# Altium integrated library Samtec_2_mm_Pitch_Socket_Strips.IntLib: 251 symbols (part 2 of 3)
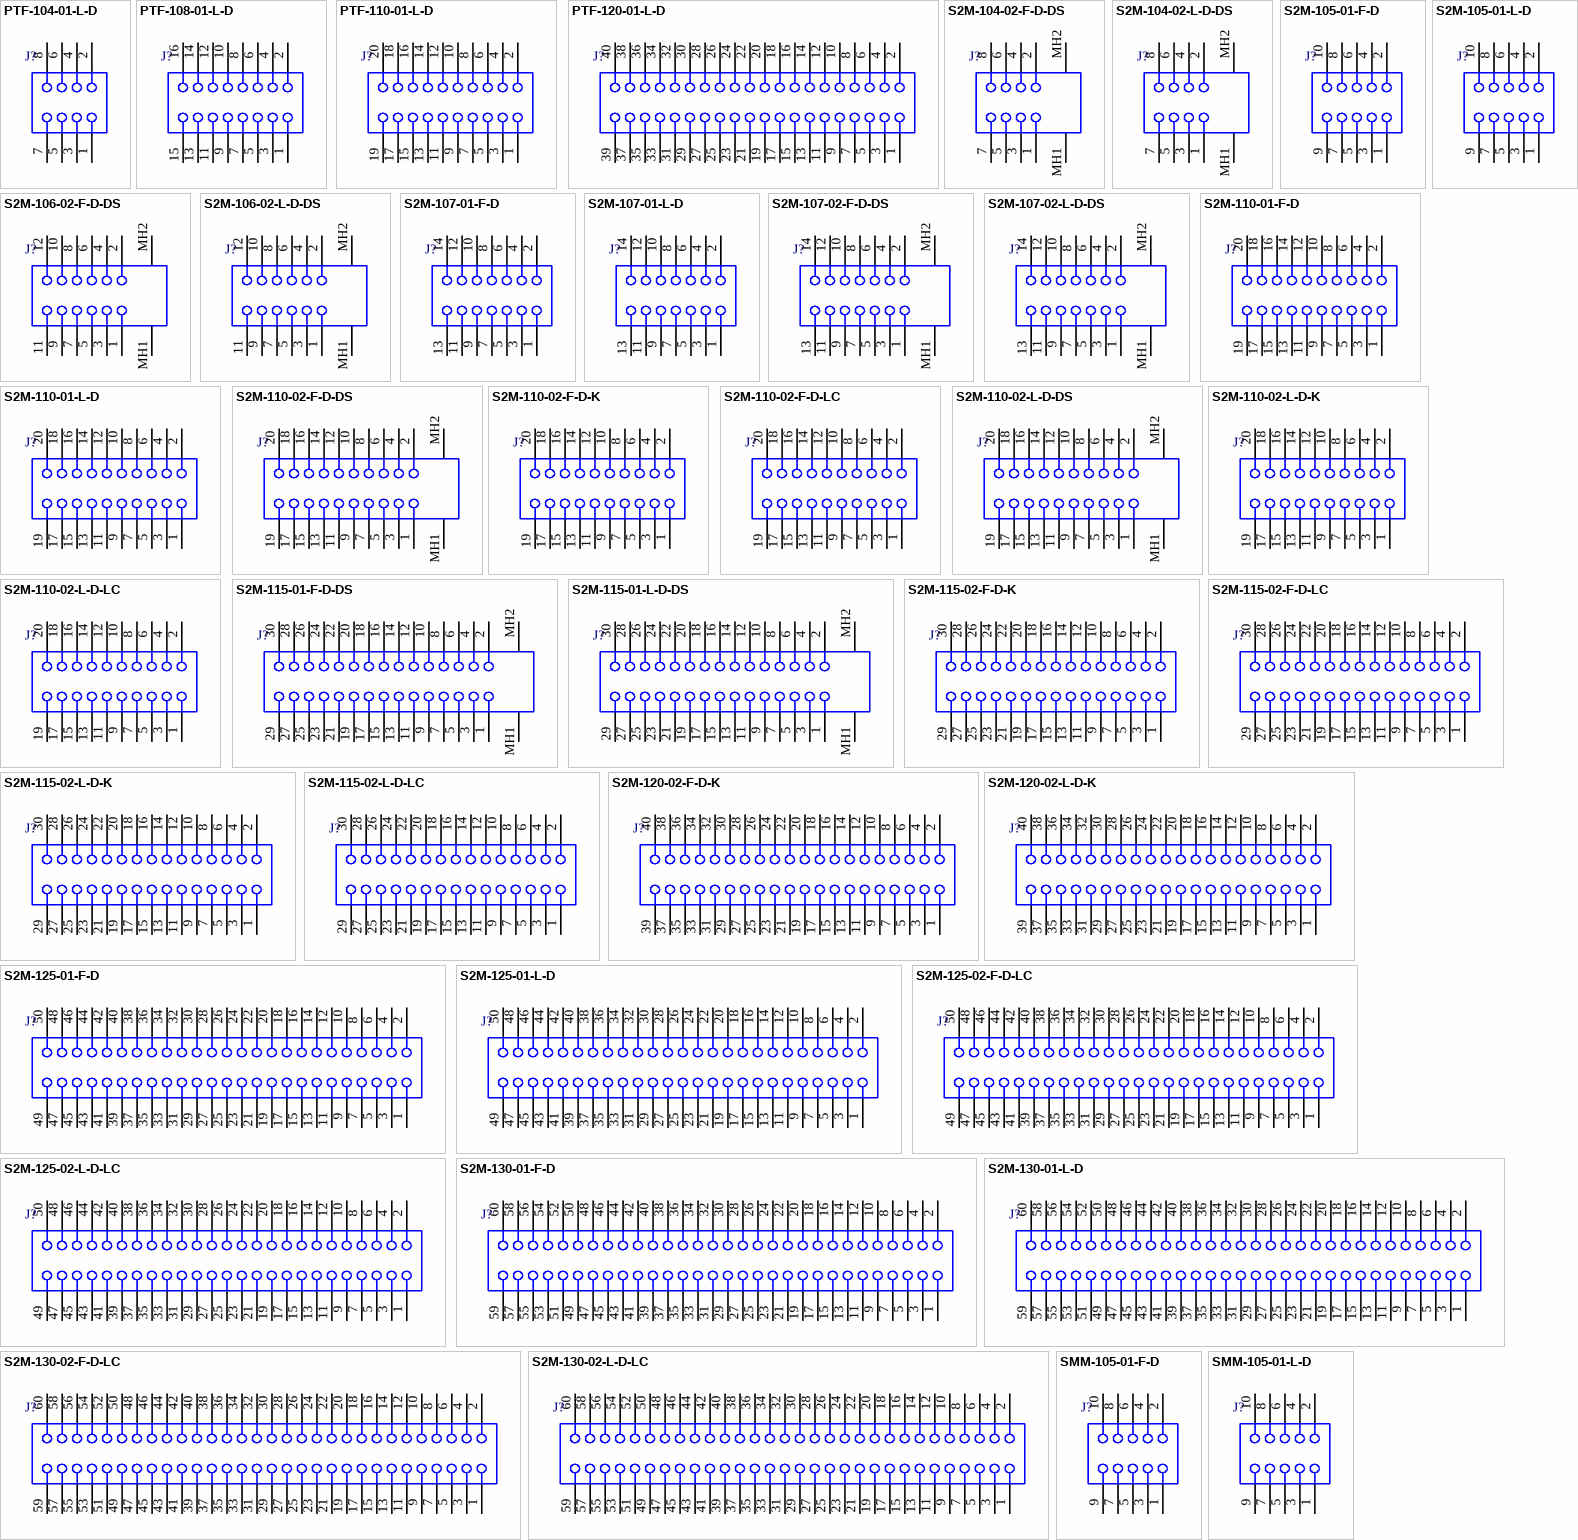
[diagram p7: symbols PTF-104-01-L-D to SMM-105-01-L-D]

## S2M-106-02-L-D-DS
designator J?
High Reliability Cable Socket, Surface Mount, Vertical, -55 to 125 degC, 2 mm Pitch, 12-Pin, Female, RoHS; Manufacturer: Samtec; PartNumber: S2M-106-02-L-D-DS; Pitch: 2 mm; DatasheetVersion: F-214; PackageVersion: M, 9/2010; PackageReference: S2M-106-02-X-D-DS; PackageDescription: 2 mm Double Row Socket Strip; Orientation: Vertical; RoHS: True; Temperature Range: -55 to 125 degC; Mounting Technology: Surface Mount; ComponentLink1Description: Manufacturer URL; ComponentLink1URL: http://www.samtec.com; ComponentLink2Description: Datasheet; ComponentLink2URL: http://www.samtec.com/documents/webfiles/pdf/s2m.pdf; ComponentLink3Description: Package Specification; ComponentLink3URL: http://www.samtec.com/documents/webfiles/cpdf/S2M-1XX-XX-X-D-XX-XX-MKT.pdf
footprint SMTC-S2M-106-02-X-D-DS (Socket Strip, 2x6 Pins, Vertical, 2mm Pitch, Female)
pins: 1, 2, 3, 4, 5, 6, 7, 8, 9, 10, 11, 12, MH1, MH2

## S2M-107-01-F-D
designator J?
High Reliability Cable Socket, Through-hole, Vertical, -55 to 125 degC, 2 mm Pitch, 14-Pin, Female, RoHS; Manufacturer: Samtec; PartNumber: S2M-107-01-F-D; Pitch: 2 mm; DatasheetVersion: F-214; PackageVersion: M, 9/2010; PackageReference: S2M-107-01-X-D; PackageDescription: 2 mm Double Row Socket Strip; Orientation: Vertical; RoHS: True; Temperature Range: -55 to 125 degC; Mounting Technology: Through-hole; ComponentLink1Description: Manufacturer URL; ComponentLink1URL: http://www.samtec.com; ComponentLink2Description: Datasheet; ComponentLink2URL: http://www.samtec.com/documents/webfiles/pdf/s2m.pdf; ComponentLink3Description: Package Specification; ComponentLink3URL: http://www.samtec.com/documents/webfiles/cpdf/S2M-1XX-XX-X-D-XX-XX-MKT.pdf
footprint SMTC-S2M-107-01-X-D (Socket Strip, 2x7 Pins, Vertical, 2mm Pitch, Female)
pins: 1, 2, 3, 4, 5, 6, 7, 8, 9, 10, 11, 12, 13, 14

## S2M-107-01-L-D
designator J?
High Reliability Cable Socket, Through-hole, Vertical, -55 to 125 degC, 2 mm Pitch, 14-Pin, Female, RoHS; Manufacturer: Samtec; PartNumber: S2M-107-01-L-D; Pitch: 2 mm; DatasheetVersion: F-214; PackageVersion: M, 9/2010; PackageReference: S2M-107-01-X-D; PackageDescription: 2 mm Double Row Socket Strip; Supplier 1: Farnell; Supplier Part Number 1: 2085241; Orientation: Vertical; RoHS: True; Temperature Range: -55 to 125 degC; Mounting Technology: Through-hole; ComponentLink1Description: Manufacturer URL; ComponentLink1URL: http://www.samtec.com; ComponentLink2Description: Datasheet; ComponentLink2URL: http://www.samtec.com/documents/webfiles/pdf/s2m.pdf; ComponentLink3Description: Package Specification; ComponentLink3URL: http://www.samtec.com/documents/webfiles/cpdf/S2M-1XX-XX-X-D-XX-XX-MKT.pdf
footprint SMTC-S2M-107-01-X-D (Socket Strip, 2x7 Pins, Vertical, 2mm Pitch, Female)
pins: 1, 2, 3, 4, 5, 6, 7, 8, 9, 10, 11, 12, 13, 14

## S2M-107-02-F-D-DS
designator J?
High Reliability Cable Socket, Surface Mount, Vertical, -55 to 125 degC, 2 mm Pitch, 14-Pin, Female, RoHS; Manufacturer: Samtec; PartNumber: S2M-107-02-F-D-DS; Pitch: 2 mm; DatasheetVersion: F-214; PackageVersion: M, 9/2010; PackageReference: S2M-107-02-X-D-DS; PackageDescription: 2 mm Double Row Socket Strip; Orientation: Vertical; RoHS: True; Temperature Range: -55 to 125 degC; Mounting Technology: Surface Mount; ComponentLink1Description: Manufacturer URL; ComponentLink1URL: http://www.samtec.com; ComponentLink2Description: Datasheet; ComponentLink2URL: http://www.samtec.com/documents/webfiles/pdf/s2m.pdf; ComponentLink3Description: Package Specification; ComponentLink3URL: http://www.samtec.com/documents/webfiles/cpdf/S2M-1XX-XX-X-D-XX-XX-MKT.pdf
footprint SMTC-S2M-107-02-X-D-DS (Socket Strip, 2x7 Pins, Vertical, 2mm Pitch, Female)
pins: 1, 2, 3, 4, 5, 6, 7, 8, 9, 10, 11, 12, 13, 14, MH1, MH2

## S2M-107-02-L-D-DS
designator J?
High Reliability Cable Socket, Surface Mount, Vertical, -55 to 125 degC, 2 mm Pitch, 14-Pin, Female, RoHS; Manufacturer: Samtec; PartNumber: S2M-107-02-L-D-DS; Pitch: 2 mm; DatasheetVersion: F-214; PackageVersion: M, 9/2010; PackageReference: S2M-107-02-X-D-DS; PackageDescription: 2 mm Double Row Socket Strip; Orientation: Vertical; RoHS: True; Temperature Range: -55 to 125 degC; Mounting Technology: Surface Mount; ComponentLink1Description: Manufacturer URL; ComponentLink1URL: http://www.samtec.com; ComponentLink2Description: Datasheet; ComponentLink2URL: http://www.samtec.com/documents/webfiles/pdf/s2m.pdf; ComponentLink3Description: Package Specification; ComponentLink3URL: http://www.samtec.com/documents/webfiles/cpdf/S2M-1XX-XX-X-D-XX-XX-MKT.pdf
footprint SMTC-S2M-107-02-X-D-DS (Socket Strip, 2x7 Pins, Vertical, 2mm Pitch, Female)
pins: 1, 2, 3, 4, 5, 6, 7, 8, 9, 10, 11, 12, 13, 14, MH1, MH2

## S2M-110-01-F-D
designator J?
High Reliability Cable Socket, Through-hole, Vertical, -55 to 125 degC, 2 mm Pitch, 20-Pin, Female, RoHS; Manufacturer: Samtec; PartNumber: S2M-110-01-F-D; Pitch: 2 mm; DatasheetVersion: F-214; PackageVersion: M, 9/2010; PackageReference: S2M-110-01-X-D; PackageDescription: 2 mm Double Row Socket Strip; Orientation: Vertical; RoHS: True; Temperature Range: -55 to 125 degC; Mounting Technology: Through-hole; ComponentLink1Description: Manufacturer URL; ComponentLink1URL: http://www.samtec.com; ComponentLink2Description: Datasheet; ComponentLink2URL: http://www.samtec.com/documents/webfiles/pdf/s2m.pdf; ComponentLink3Description: Package Specification; ComponentLink3URL: http://www.samtec.com/documents/webfiles/cpdf/S2M-1XX-XX-X-D-XX-XX-MKT.pdf
footprint SMTC-S2M-110-01-X-D (Socket Strip, 2x10 Pins, Vertical, 2mm Pitch, Female)
pins: 1, 2, 3, 4, 5, 6, 7, 8, 9, 10, 11, 12, 13, 14, 15, 16, 17, 18, 19, 20

## S2M-110-01-L-D
designator J?
High Reliability Cable Socket, Through-hole, Vertical, -55 to 125 degC, 2 mm Pitch, 20-Pin, Female, RoHS; Manufacturer: Samtec; PartNumber: S2M-110-01-L-D; Pitch: 2 mm; DatasheetVersion: F-214; PackageVersion: M, 9/2010; PackageReference: S2M-110-01-X-D; PackageDescription: 2 mm Double Row Socket Strip; Supplier 1: Farnell; Supplier Part Number 1: 2085242; Orientation: Vertical; RoHS: True; Temperature Range: -55 to 125 degC; Mounting Technology: Through-hole; ComponentLink1Description: Manufacturer URL; ComponentLink1URL: http://www.samtec.com; ComponentLink2Description: Datasheet; ComponentLink2URL: http://www.samtec.com/documents/webfiles/pdf/s2m.pdf; ComponentLink3Description: Package Specification; ComponentLink3URL: http://www.samtec.com/documents/webfiles/cpdf/S2M-1XX-XX-X-D-XX-XX-MKT.pdf
footprint SMTC-S2M-110-01-X-D (Socket Strip, 2x10 Pins, Vertical, 2mm Pitch, Female)
pins: 1, 2, 3, 4, 5, 6, 7, 8, 9, 10, 11, 12, 13, 14, 15, 16, 17, 18, 19, 20

## S2M-110-02-F-D-DS
designator J?
High Reliability Cable Socket, Surface Mount, Vertical, -55 to 125 degC, 2 mm Pitch, 20-Pin, Female, RoHS; Manufacturer: Samtec; PartNumber: S2M-110-02-F-D-DS; Pitch: 2 mm; DatasheetVersion: F-214; PackageVersion: M, 9/2010; PackageReference: S2M-110-02-X-D-DS; PackageDescription: 2 mm Double Row Socket Strip; Orientation: Vertical; RoHS: True; Temperature Range: -55 to 125 degC; Mounting Technology: Surface Mount; ComponentLink1Description: Manufacturer URL; ComponentLink1URL: http://www.samtec.com; ComponentLink2Description: Datasheet; ComponentLink2URL: http://www.samtec.com/documents/webfiles/pdf/s2m.pdf; ComponentLink3Description: Package Specification; ComponentLink3URL: http://www.samtec.com/documents/webfiles/cpdf/S2M-1XX-XX-X-D-XX-XX-MKT.pdf
footprint SMTC-S2M-110-02-X-D-DS (Socket Strip, 2x10 Pins, Vertical, 2mm Pitch, Female)
pins: 1, 2, 3, 4, 5, 6, 7, 8, 9, 10, 11, 12, 13, 14, 15, 16, 17, 18, 19, 20, MH1, MH2

## S2M-110-02-F-D-K
designator J?
High Reliability Cable Socket, Surface Mount, Vertical, -55 to 125 degC, 2 mm Pitch, 20-Pin, Female, RoHS; Manufacturer: Samtec; PartNumber: S2M-110-02-F-D-K; Pitch: 2 mm; DatasheetVersion: F-214; PackageVersion: M, 9/2010; PackageReference: S2M-110-02-X-D-K; PackageDescription: 2 mm Double Row Socket Strip; Orientation: Vertical; RoHS: True; Temperature Range: -55 to 125 degC; Mounting Technology: Surface Mount; ComponentLink1Description: Manufacturer URL; ComponentLink1URL: http://www.samtec.com; ComponentLink2Description: Datasheet; ComponentLink2URL: http://www.samtec.com/documents/webfiles/pdf/s2m.pdf; ComponentLink3Description: Package Specification; ComponentLink3URL: http://www.samtec.com/documents/webfiles/cpdf/S2M-1XX-XX-X-D-XX-XX-MKT.pdf
footprint SMTC-S2M-110-02-X-D-K (Socket Strip, 2x10 Pins, Vertical, 2mm Pitch, Female)
pins: 1, 2, 3, 4, 5, 6, 7, 8, 9, 10, 11, 12, 13, 14, 15, 16, 17, 18, 19, 20

## S2M-110-02-F-D-LC
designator J?
High Reliability Cable Socket, Surface Mount, Vertical, -55 to 125 degC, 2 mm Pitch, 20-Pin, Female, RoHS; Manufacturer: Samtec; PartNumber: S2M-110-02-F-D-LC; Pitch: 2 mm; DatasheetVersion: F-214; PackageVersion: M, 9/2010; PackageReference: S2M-110-02-X-D-LC; PackageDescription: 2 mm Double Row Socket Strip; Orientation: Vertical; RoHS: True; Temperature Range: -55 to 125 degC; Mounting Technology: Surface Mount; ComponentLink1Description: Manufacturer URL; ComponentLink1URL: http://www.samtec.com; ComponentLink2Description: Datasheet; ComponentLink2URL: http://www.samtec.com/documents/webfiles/pdf/s2m.pdf; ComponentLink3Description: Package Specification; ComponentLink3URL: http://www.samtec.com/documents/webfiles/cpdf/S2M-1XX-XX-X-D-XX-XX-MKT.pdf
footprint SMTC-S2M-110-02-X-D-LC (Socket Strip, 2x10 Pins, Vertical, 2mm Pitch, Female)
pins: 1, 2, 3, 4, 5, 6, 7, 8, 9, 10, 11, 12, 13, 14, 15, 16, 17, 18, 19, 20

## S2M-110-02-L-D-DS
designator J?
High Reliability Cable Socket, Surface Mount, Vertical, -55 to 125 degC, 2 mm Pitch, 20-Pin, Female, RoHS; Manufacturer: Samtec; PartNumber: S2M-110-02-L-D-DS; Pitch: 2 mm; DatasheetVersion: F-214; PackageVersion: M, 9/2010; PackageReference: S2M-110-02-X-D-DS; PackageDescription: 2 mm Double Row Socket Strip; Orientation: Vertical; RoHS: True; Temperature Range: -55 to 125 degC; Mounting Technology: Surface Mount; ComponentLink1Description: Manufacturer URL; ComponentLink1URL: http://www.samtec.com; ComponentLink2Description: Datasheet; ComponentLink2URL: http://www.samtec.com/documents/webfiles/pdf/s2m.pdf; ComponentLink3Description: Package Specification; ComponentLink3URL: http://www.samtec.com/documents/webfiles/cpdf/S2M-1XX-XX-X-D-XX-XX-MKT.pdf
footprint SMTC-S2M-110-02-X-D-DS (Socket Strip, 2x10 Pins, Vertical, 2mm Pitch, Female)
pins: 1, 2, 3, 4, 5, 6, 7, 8, 9, 10, 11, 12, 13, 14, 15, 16, 17, 18, 19, 20, MH1, MH2

## S2M-110-02-L-D-K
designator J?
High Reliability Cable Socket, Surface Mount, Vertical, -55 to 125 degC, 2 mm Pitch, 20-Pin, Female, RoHS; Manufacturer: Samtec; PartNumber: S2M-110-02-L-D-K; Pitch: 2 mm; DatasheetVersion: F-214; PackageVersion: M, 9/2010; PackageReference: S2M-110-02-X-D-K; PackageDescription: 2 mm Double Row Socket Strip; Orientation: Vertical; RoHS: True; Temperature Range: -55 to 125 degC; Mounting Technology: Surface Mount; ComponentLink1Description: Manufacturer URL; ComponentLink1URL: http://www.samtec.com; ComponentLink2Description: Datasheet; ComponentLink2URL: http://www.samtec.com/documents/webfiles/pdf/s2m.pdf; ComponentLink3Description: Package Specification; ComponentLink3URL: http://www.samtec.com/documents/webfiles/cpdf/S2M-1XX-XX-X-D-XX-XX-MKT.pdf
footprint SMTC-S2M-110-02-X-D-K (Socket Strip, 2x10 Pins, Vertical, 2mm Pitch, Female)
pins: 1, 2, 3, 4, 5, 6, 7, 8, 9, 10, 11, 12, 13, 14, 15, 16, 17, 18, 19, 20

## S2M-110-02-L-D-LC
designator J?
High Reliability Cable Socket, Surface Mount, Vertical, -55 to 125 degC, 2 mm Pitch, 20-Pin, Female, RoHS; Manufacturer: Samtec; PartNumber: S2M-110-02-L-D-LC; Pitch: 2 mm; DatasheetVersion: F-214; PackageVersion: M, 9/2010; PackageReference: S2M-110-02-X-D-LC; PackageDescription: 2 mm Double Row Socket Strip; Orientation: Vertical; RoHS: True; Temperature Range: -55 to 125 degC; Mounting Technology: Surface Mount; ComponentLink1Description: Manufacturer URL; ComponentLink1URL: http://www.samtec.com; ComponentLink2Description: Datasheet; ComponentLink2URL: http://www.samtec.com/documents/webfiles/pdf/s2m.pdf; ComponentLink3Description: Package Specification; ComponentLink3URL: http://www.samtec.com/documents/webfiles/cpdf/S2M-1XX-XX-X-D-XX-XX-MKT.pdf
footprint SMTC-S2M-110-02-X-D-LC (Socket Strip, 2x10 Pins, Vertical, 2mm Pitch, Female)
pins: 1, 2, 3, 4, 5, 6, 7, 8, 9, 10, 11, 12, 13, 14, 15, 16, 17, 18, 19, 20

## S2M-115-01-F-D-DS
designator J?
High Reliability Cable Socket, Through-hole, Vertical, -55 to 125 degC, 2 mm Pitch, 30-Pin, Female, RoHS; Manufacturer: Samtec; PartNumber: S2M-115-01-F-D-DS; Pitch: 2 mm; DatasheetVersion: F-214; PackageVersion: M, 9/2010; PackageReference: S2M-115-01-X-D-DS; PackageDescription: 2 mm Double Row Socket Strip; Orientation: Vertical; RoHS: True; Temperature Range: -55 to 125 degC; Mounting Technology: Through-hole; ComponentLink1Description: Manufacturer URL; ComponentLink1URL: http://www.samtec.com; ComponentLink2Description: Datasheet; ComponentLink2URL: http://www.samtec.com/documents/webfiles/pdf/s2m.pdf; ComponentLink3Description: Package Specification; ComponentLink3URL: http://www.samtec.com/documents/webfiles/cpdf/S2M-1XX-XX-X-D-XX-XX-MKT.pdf
footprint SMTC-S2M-115-01-X-D-DS (Socket Strip, 2x15 Pins, Vertical, 2mm Pitch, Female)
pins: 1, 2, 3, 4, 5, 6, 7, 8, 9, 10, 11, 12, 13, 14, 15, 16, 17, 18, 19, 20, 21, 22, 23, 24, 25, 26, 27, 28, 29, 30, MH1, MH2

## S2M-115-01-L-D-DS
designator J?
High Reliability Cable Socket, Through-hole, Vertical, -55 to 125 degC, 2 mm Pitch, 30-Pin, Female, RoHS; Manufacturer: Samtec; PartNumber: S2M-115-01-L-D-DS; Pitch: 2 mm; DatasheetVersion: F-214; PackageVersion: M, 9/2010; PackageReference: S2M-115-01-X-D-DS; PackageDescription: 2 mm Double Row Socket Strip; Orientation: Vertical; RoHS: True; Temperature Range: -55 to 125 degC; Mounting Technology: Through-hole; ComponentLink1Description: Manufacturer URL; ComponentLink1URL: http://www.samtec.com; ComponentLink2Description: Datasheet; ComponentLink2URL: http://www.samtec.com/documents/webfiles/pdf/s2m.pdf; ComponentLink3Description: Package Specification; ComponentLink3URL: http://www.samtec.com/documents/webfiles/cpdf/S2M-1XX-XX-X-D-XX-XX-MKT.pdf
footprint SMTC-S2M-115-01-X-D-DS (Socket Strip, 2x15 Pins, Vertical, 2mm Pitch, Female)
pins: 1, 2, 3, 4, 5, 6, 7, 8, 9, 10, 11, 12, 13, 14, 15, 16, 17, 18, 19, 20, 21, 22, 23, 24, 25, 26, 27, 28, 29, 30, MH1, MH2

## S2M-115-02-F-D-K
designator J?
High Reliability Cable Socket, Surface Mount, Vertical, -55 to 125 degC, 2 mm Pitch, 30-Pin, Female, RoHS; Manufacturer: Samtec; PartNumber: S2M-115-02-F-D-K; Pitch: 2 mm; DatasheetVersion: F-214; PackageVersion: M, 9/2010; PackageReference: S2M-115-02-X-D-K; PackageDescription: 2 mm Double Row Socket Strip; Orientation: Vertical; RoHS: True; Temperature Range: -55 to 125 degC; Mounting Technology: Surface Mount; ComponentLink1Description: Manufacturer URL; ComponentLink1URL: http://www.samtec.com; ComponentLink2Description: Datasheet; ComponentLink2URL: http://www.samtec.com/documents/webfiles/pdf/s2m.pdf; ComponentLink3Description: Package Specification; ComponentLink3URL: http://www.samtec.com/documents/webfiles/cpdf/S2M-1XX-XX-X-D-XX-XX-MKT.pdf
footprint SMTC-S2M-115-02-X-D-K (Socket Strip, 2x15 Pins, Vertical, 2mm Pitch, Female)
pins: 1, 2, 3, 4, 5, 6, 7, 8, 9, 10, 11, 12, 13, 14, 15, 16, 17, 18, 19, 20, 21, 22, 23, 24, 25, 26, 27, 28, 29, 30

## S2M-115-02-F-D-LC
designator J?
High Reliability Cable Socket, Surface Mount, Vertical, -55 to 125 degC, 2 mm Pitch, 30-Pin, Female, RoHS; Manufacturer: Samtec; PartNumber: S2M-115-02-F-D-LC; Pitch: 2 mm; DatasheetVersion: F-214; PackageVersion: M, 9/2010; PackageReference: S2M-115-02-X-D-LC; PackageDescription: 2 mm Double Row Socket Strip; Orientation: Vertical; RoHS: True; Temperature Range: -55 to 125 degC; Mounting Technology: Surface Mount; ComponentLink1Description: Manufacturer URL; ComponentLink1URL: http://www.samtec.com; ComponentLink2Description: Datasheet; ComponentLink2URL: http://www.samtec.com/documents/webfiles/pdf/s2m.pdf; ComponentLink3Description: Package Specification; ComponentLink3URL: http://www.samtec.com/documents/webfiles/cpdf/S2M-1XX-XX-X-D-XX-XX-MKT.pdf
footprint SMTC-S2M-115-02-X-D-LC (Socket Strip, 2x15 Pins, Vertical, 2mm Pitch, Female)
pins: 1, 2, 3, 4, 5, 6, 7, 8, 9, 10, 11, 12, 13, 14, 15, 16, 17, 18, 19, 20, 21, 22, 23, 24, 25, 26, 27, 28, 29, 30

## S2M-115-02-L-D-K
designator J?
High Reliability Cable Socket, Surface Mount, Vertical, -55 to 125 degC, 2 mm Pitch, 30-Pin, Female, RoHS; Manufacturer: Samtec; PartNumber: S2M-115-02-L-D-K; Pitch: 2 mm; DatasheetVersion: F-214; PackageVersion: M, 9/2010; PackageReference: S2M-115-02-X-D-K; PackageDescription: 2 mm Double Row Socket Strip; Orientation: Vertical; RoHS: True; Temperature Range: -55 to 125 degC; Mounting Technology: Surface Mount; ComponentLink1Description: Manufacturer URL; ComponentLink1URL: http://www.samtec.com; ComponentLink2Description: Datasheet; ComponentLink2URL: http://www.samtec.com/documents/webfiles/pdf/s2m.pdf; ComponentLink3Description: Package Specification; ComponentLink3URL: http://www.samtec.com/documents/webfiles/cpdf/S2M-1XX-XX-X-D-XX-XX-MKT.pdf
footprint SMTC-S2M-115-02-X-D-K (Socket Strip, 2x15 Pins, Vertical, 2mm Pitch, Female)
pins: 1, 2, 3, 4, 5, 6, 7, 8, 9, 10, 11, 12, 13, 14, 15, 16, 17, 18, 19, 20, 21, 22, 23, 24, 25, 26, 27, 28, 29, 30

## S2M-115-02-L-D-LC
designator J?
High Reliability Cable Socket, Surface Mount, Vertical, -55 to 125 degC, 2 mm Pitch, 30-Pin, Female, RoHS; Manufacturer: Samtec; PartNumber: S2M-115-02-L-D-LC; Pitch: 2 mm; DatasheetVersion: F-214; PackageVersion: M, 9/2010; PackageReference: S2M-115-02-X-D-LC; PackageDescription: 2 mm Double Row Socket Strip; Orientation: Vertical; RoHS: True; Temperature Range: -55 to 125 degC; Mounting Technology: Surface Mount; ComponentLink1Description: Manufacturer URL; ComponentLink1URL: http://www.samtec.com; ComponentLink2Description: Datasheet; ComponentLink2URL: http://www.samtec.com/documents/webfiles/pdf/s2m.pdf; ComponentLink3Description: Package Specification; ComponentLink3URL: http://www.samtec.com/documents/webfiles/cpdf/S2M-1XX-XX-X-D-XX-XX-MKT.pdf
footprint SMTC-S2M-115-02-X-D-LC (Socket Strip, 2x15 Pins, Vertical, 2mm Pitch, Female)
pins: 1, 2, 3, 4, 5, 6, 7, 8, 9, 10, 11, 12, 13, 14, 15, 16, 17, 18, 19, 20, 21, 22, 23, 24, 25, 26, 27, 28, 29, 30

## S2M-120-02-F-D-K
designator J?
High Reliability Cable Socket, Surface Mount, Vertical, -55 to 125 degC, 2 mm Pitch, 40-Pin, Female, RoHS; Manufacturer: Samtec; PartNumber: S2M-120-02-F-D-K; Pitch: 2 mm; DatasheetVersion: F-214; PackageVersion: M, 9/2010; PackageReference: S2M-120-02-X-D-K; PackageDescription: 2 mm Double Row Socket Strip; Orientation: Vertical; RoHS: True; Temperature Range: -55 to 125 degC; Mounting Technology: Surface Mount; ComponentLink1Description: Manufacturer URL; ComponentLink1URL: http://www.samtec.com; ComponentLink2Description: Datasheet; ComponentLink2URL: http://www.samtec.com/documents/webfiles/pdf/s2m.pdf; ComponentLink3Description: Package Specification; ComponentLink3URL: http://www.samtec.com/documents/webfiles/cpdf/S2M-1XX-XX-X-D-XX-XX-MKT.pdf
footprint SMTC-S2M-120-02-X-D-K (Socket Strip, 2x20 Pins, Vertical, 2mm Pitch, Female)
pins: 1, 2, 3, 4, 5, 6, 7, 8, 9, 10, 11, 12, 13, 14, 15, 16, 17, 18, 19, 20, 21, 22, 23, 24, 25, 26, 27, 28, 29, 30, 31, 32, 33, 34, 35, 36, 37, 38, 39, 40

## S2M-120-02-L-D-K
designator J?
High Reliability Cable Socket, Surface Mount, Vertical, -55 to 125 degC, 2 mm Pitch, 40-Pin, Female, RoHS; Manufacturer: Samtec; PartNumber: S2M-120-02-L-D-K; Pitch: 2 mm; DatasheetVersion: F-214; PackageVersion: M, 9/2010; PackageReference: S2M-120-02-X-D-K; PackageDescription: 2 mm Double Row Socket Strip; Orientation: Vertical; RoHS: True; Temperature Range: -55 to 125 degC; Mounting Technology: Surface Mount; ComponentLink1Description: Manufacturer URL; ComponentLink1URL: http://www.samtec.com; ComponentLink2Description: Datasheet; ComponentLink2URL: http://www.samtec.com/documents/webfiles/pdf/s2m.pdf; ComponentLink3Description: Package Specification; ComponentLink3URL: http://www.samtec.com/documents/webfiles/cpdf/S2M-1XX-XX-X-D-XX-XX-MKT.pdf
footprint SMTC-S2M-120-02-X-D-K (Socket Strip, 2x20 Pins, Vertical, 2mm Pitch, Female)
pins: 1, 2, 3, 4, 5, 6, 7, 8, 9, 10, 11, 12, 13, 14, 15, 16, 17, 18, 19, 20, 21, 22, 23, 24, 25, 26, 27, 28, 29, 30, 31, 32, 33, 34, 35, 36, 37, 38, 39, 40

## S2M-125-01-F-D
designator J?
High Reliability Cable Socket, Through-hole, Vertical, -55 to 125 degC, 2 mm Pitch, 50-Pin, Female, RoHS; Manufacturer: Samtec; PartNumber: S2M-125-01-F-D; Pitch: 2 mm; DatasheetVersion: F-214; PackageVersion: M, 9/2010; PackageReference: S2M-125-01-X-D; PackageDescription: 2 mm Double Row Socket Strip; Orientation: Vertical; RoHS: True; Temperature Range: -55 to 125 degC; Mounting Technology: Through-hole; ComponentLink1Description: Manufacturer URL; ComponentLink1URL: http://www.samtec.com; ComponentLink2Description: Datasheet; ComponentLink2URL: http://www.samtec.com/documents/webfiles/pdf/s2m.pdf; ComponentLink3Description: Package Specification; ComponentLink3URL: http://www.samtec.com/documents/webfiles/cpdf/S2M-1XX-XX-X-D-XX-XX-MKT.pdf
footprint SMTC-S2M-125-01-X-D (Socket Strip, 2x25 Pins, Vertical, 2mm Pitch, Female)
pins: 1, 2, 3, 4, 5, 6, 7, 8, 9, 10, 11, 12, 13, 14, 15, 16, 17, 18, 19, 20, 21, 22, 23, 24, 25, 26, 27, 28, 29, 30, 31, 32, 33, 34, 35, 36, 37, 38, 39, 40, 41, 42, 43, 44, 45, 46, 47, 48, 49, 50

## S2M-125-01-L-D
designator J?
High Reliability Cable Socket, Through-hole, Vertical, -55 to 125 degC, 2 mm Pitch, 50-Pin, Female, RoHS; Manufacturer: Samtec; PartNumber: S2M-125-01-L-D; Pitch: 2 mm; DatasheetVersion: F-214; PackageVersion: M, 9/2010; PackageReference: S2M-125-01-X-D; PackageDescription: 2 mm Double Row Socket Strip; Supplier 1: Farnell; Supplier Part Number 1: 2085245; Orientation: Vertical; RoHS: True; Temperature Range: -55 to 125 degC; Mounting Technology: Through-hole; ComponentLink1Description: Manufacturer URL; ComponentLink1URL: http://www.samtec.com; ComponentLink2Description: Datasheet; ComponentLink2URL: http://www.samtec.com/documents/webfiles/pdf/s2m.pdf; ComponentLink3Description: Package Specification; ComponentLink3URL: http://www.samtec.com/documents/webfiles/cpdf/S2M-1XX-XX-X-D-XX-XX-MKT.pdf
footprint SMTC-S2M-125-01-X-D (Socket Strip, 2x25 Pins, Vertical, 2mm Pitch, Female)
pins: 1, 2, 3, 4, 5, 6, 7, 8, 9, 10, 11, 12, 13, 14, 15, 16, 17, 18, 19, 20, 21, 22, 23, 24, 25, 26, 27, 28, 29, 30, 31, 32, 33, 34, 35, 36, 37, 38, 39, 40, 41, 42, 43, 44, 45, 46, 47, 48, 49, 50

## S2M-125-02-F-D-LC
designator J?
High Reliability Cable Socket, Surface Mount, Vertical, -55 to 125 degC, 2 mm Pitch, 50-Pin, Female, RoHS; Manufacturer: Samtec; PartNumber: S2M-125-02-F-D-LC; Pitch: 2 mm; DatasheetVersion: F-214; PackageVersion: M, 9/2010; PackageReference: S2M-125-02-X-D-LC; PackageDescription: 2 mm Double Row Socket Strip; Orientation: Vertical; RoHS: True; Temperature Range: -55 to 125 degC; Mounting Technology: Surface Mount; ComponentLink1Description: Manufacturer URL; ComponentLink1URL: http://www.samtec.com; ComponentLink2Description: Datasheet; ComponentLink2URL: http://www.samtec.com/documents/webfiles/pdf/s2m.pdf; ComponentLink3Description: Package Specification; ComponentLink3URL: http://www.samtec.com/documents/webfiles/cpdf/S2M-1XX-XX-X-D-XX-XX-MKT.pdf
footprint SMTC-S2M-125-02-X-D-LC (Socket Strip, 2x25 Pins, Vertical, 2mm Pitch, Female)
pins: 1, 2, 3, 4, 5, 6, 7, 8, 9, 10, 11, 12, 13, 14, 15, 16, 17, 18, 19, 20, 21, 22, 23, 24, 25, 26, 27, 28, 29, 30, 31, 32, 33, 34, 35, 36, 37, 38, 39, 40, 41, 42, 43, 44, 45, 46, 47, 48, 49, 50

## S2M-125-02-L-D-LC
designator J?
High Reliability Cable Socket, Surface Mount, Vertical, -55 to 125 degC, 2 mm Pitch, 50-Pin, Female, RoHS; Manufacturer: Samtec; PartNumber: S2M-125-02-L-D-LC; Pitch: 2 mm; DatasheetVersion: F-214; PackageVersion: M, 9/2010; PackageReference: S2M-125-02-X-D-LC; PackageDescription: 2 mm Double Row Socket Strip; Orientation: Vertical; RoHS: True; Temperature Range: -55 to 125 degC; Mounting Technology: Surface Mount; ComponentLink1Description: Manufacturer URL; ComponentLink1URL: http://www.samtec.com; ComponentLink2Description: Datasheet; ComponentLink2URL: http://www.samtec.com/documents/webfiles/pdf/s2m.pdf; ComponentLink3Description: Package Specification; ComponentLink3URL: http://www.samtec.com/documents/webfiles/cpdf/S2M-1XX-XX-X-D-XX-XX-MKT.pdf
footprint SMTC-S2M-125-02-X-D-LC (Socket Strip, 2x25 Pins, Vertical, 2mm Pitch, Female)
pins: 1, 2, 3, 4, 5, 6, 7, 8, 9, 10, 11, 12, 13, 14, 15, 16, 17, 18, 19, 20, 21, 22, 23, 24, 25, 26, 27, 28, 29, 30, 31, 32, 33, 34, 35, 36, 37, 38, 39, 40, 41, 42, 43, 44, 45, 46, 47, 48, 49, 50

## S2M-130-01-F-D
designator J?
High Reliability Cable Socket, Through-hole, Vertical, -55 to 125 degC, 2 mm Pitch, 60-Pin, Female, RoHS; Manufacturer: Samtec; PartNumber: S2M-130-01-F-D; Pitch: 2 mm; DatasheetVersion: F-214; PackageVersion: M, 9/2010; PackageReference: S2M-130-01-X-D; PackageDescription: 2 mm Double Row Socket Strip; Orientation: Vertical; RoHS: True; Temperature Range: -55 to 125 degC; Mounting Technology: Through-hole; ComponentLink1Description: Manufacturer URL; ComponentLink1URL: http://www.samtec.com; ComponentLink2Description: Datasheet; ComponentLink2URL: http://www.samtec.com/documents/webfiles/pdf/s2m.pdf; ComponentLink3Description: Package Specification; ComponentLink3URL: http://www.samtec.com/documents/webfiles/cpdf/S2M-1XX-XX-X-D-XX-XX-MKT.pdf
footprint SMTC-S2M-130-01-X-D (Socket Strip, 2x30 Pins, Vertical, 2mm Pitch, Female)
pins: 1, 2, 3, 4, 5, 6, 7, 8, 9, 10, 11, 12, 13, 14, 15, 16, 17, 18, 19, 20, 21, 22, 23, 24, 25, 26, 27, 28, 29, 30, 31, 32, 33, 34, 35, 36, 37, 38, 39, 40, 41, 42, 43, 44, 45, 46, 47, 48, 49, 50, 51, 52, 53, 54, 55, 56, 57, 58, 59, 60

## S2M-130-01-L-D
designator J?
High Reliability Cable Socket, Through-hole, Vertical, -55 to 125 degC, 2 mm Pitch, 60-Pin, Female, RoHS; Manufacturer: Samtec; PartNumber: S2M-130-01-L-D; Pitch: 2 mm; DatasheetVersion: F-214; PackageVersion: M, 9/2010; PackageReference: S2M-130-01-X-D; PackageDescription: 2 mm Double Row Socket Strip; Supplier 1: Farnell; Supplier Part Number 1: 2085246; Orientation: Vertical; RoHS: True; Temperature Range: -55 to 125 degC; Mounting Technology: Through-hole; ComponentLink1Description: Manufacturer URL; ComponentLink1URL: http://www.samtec.com; ComponentLink2Description: Datasheet; ComponentLink2URL: http://www.samtec.com/documents/webfiles/pdf/s2m.pdf; ComponentLink3Description: Package Specification; ComponentLink3URL: http://www.samtec.com/documents/webfiles/cpdf/S2M-1XX-XX-X-D-XX-XX-MKT.pdf
footprint SMTC-S2M-130-01-X-D (Socket Strip, 2x30 Pins, Vertical, 2mm Pitch, Female)
pins: 1, 2, 3, 4, 5, 6, 7, 8, 9, 10, 11, 12, 13, 14, 15, 16, 17, 18, 19, 20, 21, 22, 23, 24, 25, 26, 27, 28, 29, 30, 31, 32, 33, 34, 35, 36, 37, 38, 39, 40, 41, 42, 43, 44, 45, 46, 47, 48, 49, 50, 51, 52, 53, 54, 55, 56, 57, 58, 59, 60

## S2M-130-02-F-D-LC
designator J?
High Reliability Cable Socket, Surface Mount, Vertical, -55 to 125 degC, 2 mm Pitch, 60-Pin, Female, RoHS; Manufacturer: Samtec; PartNumber: S2M-130-02-F-D-LC; Pitch: 2 mm; DatasheetVersion: F-214; PackageVersion: M, 9/2010; PackageReference: S2M-130-02-X-D-LC; PackageDescription: 2 mm Double Row Socket Strip; Orientation: Vertical; RoHS: True; Temperature Range: -55 to 125 degC; Mounting Technology: Surface Mount; ComponentLink1Description: Manufacturer URL; ComponentLink1URL: http://www.samtec.com; ComponentLink2Description: Datasheet; ComponentLink2URL: http://www.samtec.com/documents/webfiles/pdf/s2m.pdf; ComponentLink3Description: Package Specification; ComponentLink3URL: http://www.samtec.com/documents/webfiles/cpdf/S2M-1XX-XX-X-D-XX-XX-MKT.pdf
footprint SMTC-S2M-130-02-X-D-LC (Socket Strip, 2x30 Pins, Vertical, 2mm Pitch, Female)
pins: 1, 2, 3, 4, 5, 6, 7, 8, 9, 10, 11, 12, 13, 14, 15, 16, 17, 18, 19, 20, 21, 22, 23, 24, 25, 26, 27, 28, 29, 30, 31, 32, 33, 34, 35, 36, 37, 38, 39, 40, 41, 42, 43, 44, 45, 46, 47, 48, 49, 50, 51, 52, 53, 54, 55, 56, 57, 58, 59, 60

## S2M-130-02-L-D-LC
designator J?
High Reliability Cable Socket, Surface Mount, Vertical, -55 to 125 degC, 2 mm Pitch, 60-Pin, Female, RoHS; Manufacturer: Samtec; PartNumber: S2M-130-02-L-D-LC; Pitch: 2 mm; DatasheetVersion: F-214; PackageVersion: M, 9/2010; PackageReference: S2M-130-02-X-D-LC; PackageDescription: 2 mm Double Row Socket Strip; Orientation: Vertical; RoHS: True; Temperature Range: -55 to 125 degC; Mounting Technology: Surface Mount; ComponentLink1Description: Manufacturer URL; ComponentLink1URL: http://www.samtec.com; ComponentLink2Description: Datasheet; ComponentLink2URL: http://www.samtec.com/documents/webfiles/pdf/s2m.pdf; ComponentLink3Description: Package Specification; ComponentLink3URL: http://www.samtec.com/documents/webfiles/cpdf/S2M-1XX-XX-X-D-XX-XX-MKT.pdf
footprint SMTC-S2M-130-02-X-D-LC (Socket Strip, 2x30 Pins, Vertical, 2mm Pitch, Female)
pins: 1, 2, 3, 4, 5, 6, 7, 8, 9, 10, 11, 12, 13, 14, 15, 16, 17, 18, 19, 20, 21, 22, 23, 24, 25, 26, 27, 28, 29, 30, 31, 32, 33, 34, 35, 36, 37, 38, 39, 40, 41, 42, 43, 44, 45, 46, 47, 48, 49, 50, 51, 52, 53, 54, 55, 56, 57, 58, 59, 60

## SMM-105-01-F-D
designator J?
Tiger Eye(TM) Socket Strip, Through-hole, Vertical, -55 to 125 degC, 2 mm Pitch, 10-Pin, Female, RoHS; Manufacturer: Samtec; PartNumber: SMM-105-01-F-D; Pitch: 2 mm; DatasheetVersion: F-214; PackageVersion: AU, 5/1991; PackageReference: SMM-105-01-X-D; PackageDescription: 2 mm Socket Strip; Orientation: Vertical; RoHS: True; Temperature Range: -55 to 125 degC; Mounting Technology: Through-hole; ComponentLink1Description: Manufacturer URL; ComponentLink1URL: http://www.samtec.com; ComponentLink2Description: Datasheet; ComponentLink2URL: http://www.samtec.com/documents/webfiles/pdf/SMM.PDF; ComponentLink3Description: Package Specification; ComponentLink3URL: http://www.samtec.com/documents/webfiles/cpdf/SMM-1XX-XX-XX-D-XX-XX-X-XX-MKT1.pdf
footprint SMTC-SMM-105-01-X-D (Socket Strip, 2x5 Pins, Vertical, 2mm Pitch, Female)
pins: 1, 2, 3, 4, 5, 6, 7, 8, 9, 10

## SMM-105-01-L-D
designator J?
Tiger Eye(TM) Socket Strip, Through-hole, Vertical, -55 to 125 degC, 2 mm Pitch, 10-Pin, Female, RoHS; Manufacturer: Samtec; PartNumber: SMM-105-01-L-D; Pitch: 2 mm; DatasheetVersion: F-214; PackageVersion: AU, 5/1991; PackageReference: SMM-105-01-X-D; PackageDescription: 2 mm Socket Strip; Orientation: Vertical; RoHS: True; Temperature Range: -55 to 125 degC; Mounting Technology: Through-hole; ComponentLink1Description: Manufacturer URL; ComponentLink1URL: http://www.samtec.com; ComponentLink2Description: Datasheet; ComponentLink2URL: http://www.samtec.com/documents/webfiles/pdf/SMM.PDF; ComponentLink3Description: Package Specification; ComponentLink3URL: http://www.samtec.com/documents/webfiles/cpdf/SMM-1XX-XX-XX-D-XX-XX-X-XX-MKT1.pdf
footprint SMTC-SMM-105-01-X-D (Socket Strip, 2x5 Pins, Vertical, 2mm Pitch, Female)
pins: 1, 2, 3, 4, 5, 6, 7, 8, 9, 10
